# Altium footprint library WR-PHD_Socket Header.PcbLib: 273 footprints (part 12 of 18)
Each footprint in its own frame and in the unit in brackets; x right, y up, seen from the top. Pads: shape width x height; smd on the part's side, far side on the other; paste and mask are expansions set on the pad; w line width, h text height; cw(c..) or ccw(c..) is an arc to the next point about the centre after c.
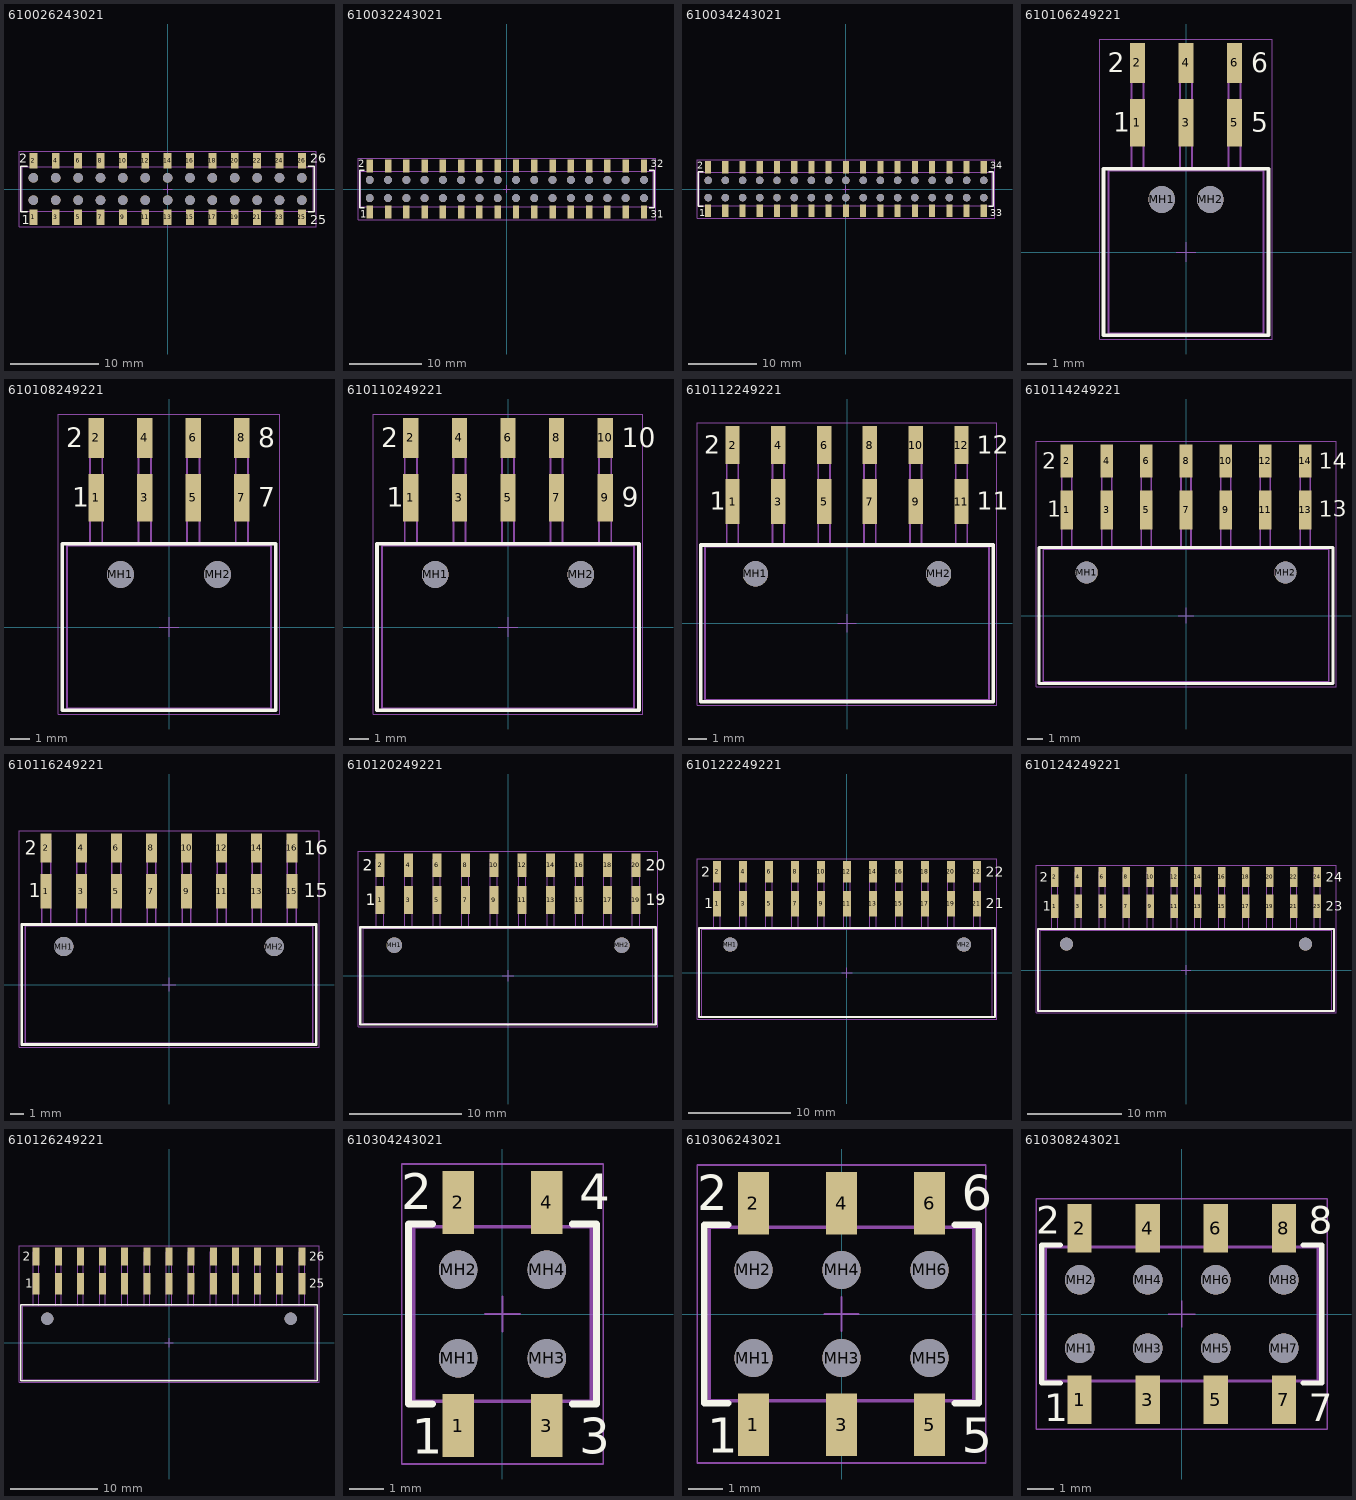
[diagram p11: the footprints below, top view; thin cyan lines are the x and y axes]

## 610026243021 [mm] "Socket Header, Pitch 2.54 mm, SMT, Vertical, dual row, 26p"
height 3.7
pads (52):
  rect 0.9x1.8 smd: 1(-15.24,-3.2) 2(-15.24,3.2) 3(-12.7,-3.2) 4(-12.7,3.2) 5(-10.16,-3.2) 6(-10.16,3.2) 7(-7.62,-3.2) 8(-7.62,3.2) 9(-5.08,-3.2) 10(-5.08,3.2) 11(-2.54,-3.2) 12(-2.54,3.2) 13(0,-3.2) 14(0,3.2) 15(2.54,-3.2) 16(2.54,3.2) 17(5.08,-3.2) 18(5.08,3.2) 19(7.62,-3.2) 20(7.62,3.2) 21(10.16,-3.2) 22(10.16,3.2) 23(12.7,-3.2) 24(12.7,3.2) 25(15.24,-3.2) 26(15.24,3.2)
  round 1.1 hole 1.1 unplated: MH1(-15.24,-1.27) MH2(-15.24,1.27) MH3(-12.7,-1.27) MH4(-12.7,1.27) MH5(-10.16,-1.27) MH6(-10.16,1.27) MH7(-7.62,-1.27) MH8(-7.62,1.27) MH9(-5.08,-1.27) MH10(-5.08,1.27) MH11(-2.54,-1.27) MH12(-2.54,1.27) MH13(0,-1.27) MH14(0,1.27) MH15(2.54,-1.27) MH16(2.54,1.27) MH17(5.08,-1.27) MH18(5.08,1.27) MH19(7.62,-1.27) MH20(7.62,1.27) MH21(10.16,-1.27) MH22(10.16,1.27) MH23(12.7,-1.27) MH24(12.7,1.27) MH25(15.24,-1.27) MH26(15.24,1.27)
Top Overlay:
  lines w0.2: -15.97,-2.575 -16.66,-2.575 -16.66,2.575 -15.97,2.575 ; 15.97,-2.575 16.66,-2.575 16.66,2.575 15.97,2.575
  text "2" at -16.87,3 h1.02
  text "1" at -16.57,-4 h1.02
  text "26" at 16.17,3 h1.02
  text "25" at 16.17,-4 h1.02
Top Designator:
  text ".Designator" at -7.498,-0.5 h1.5
Top Component Outline:
  lines w0.1: -15.49,-2.5 -15.49,-3.6 -14.99,-3.6 -14.99,-2.5 ; -15.49,2.5 -15.49,3.6 -14.99,3.6 -14.99,2.5 ; -12.95,-2.5 -12.95,-3.6 -12.45,-3.6 -12.45,-2.5 ; -12.95,2.5 -12.95,3.6 -12.45,3.6 -12.45,2.5 ; -10.41,-2.5 -10.41,-3.6 -9.91,-3.6 -9.91,-2.5 ; -10.41,2.5 -10.41,3.6 -9.91,3.6 -9.91,2.5 ; -7.87,-2.5 -7.87,-3.6 -7.37,-3.6 -7.37,-2.5 ; -7.87,2.5 -7.87,3.6 -7.37,3.6 -7.37,2.5 ; -5.33,-2.5 -5.33,-3.6 -4.83,-3.6 -4.83,-2.5 ; -5.33,2.5 -5.33,3.6 -4.83,3.6 -4.83,2.5 ; -2.79,-2.5 -2.79,-3.6 -2.29,-3.6 -2.29,-2.5 ; -2.79,2.5 -2.79,3.6 -2.29,3.6 -2.29,2.5 ; -0.25,-2.5 -0.25,-3.6 0.25,-3.6 0.25,-2.5 ; -0.25,2.5 -0.25,3.6 0.25,3.6 0.25,2.5 ; 2.29,-2.5 2.29,-3.6 2.79,-3.6 2.79,-2.5 ; 2.29,2.5 2.29,3.6 2.79,3.6 2.79,2.5 ; 4.83,-2.5 4.83,-3.6 5.33,-3.6 5.33,-2.5 ; 4.83,2.5 4.83,3.6 5.33,3.6 5.33,2.5 ; 7.37,-2.5 7.37,-3.6 7.87,-3.6 7.87,-2.5 ; 7.37,2.5 7.37,3.6 7.87,3.6 7.87,2.5 ; 9.91,-2.5 9.91,-3.6 10.41,-3.6 10.41,-2.5 ; 9.91,2.5 9.91,3.6 10.41,3.6 10.41,2.5 ; 12.45,-2.5 12.45,-3.6 12.95,-3.6 12.95,-2.5 ; 12.45,2.5 12.45,3.6 12.95,3.6 12.95,2.5 ; 14.99,-2.5 14.99,-3.6 15.49,-3.6 15.49,-2.5 ; 14.99,2.5 14.99,3.6 15.49,3.6 15.49,2.5 ; -16.51,-2.5 16.51,-2.5 16.51,2.5 -16.51,2.5 -16.51,-2.5
Top 3D Body:
  lines w0.1: -15.49,-2.5 -15.49,-3.6 -14.99,-3.6 -14.99,-2.5 ; -15.49,2.5 -15.49,3.6 -14.99,3.6 -14.99,2.5 ; -12.95,-2.5 -12.95,-3.6 -12.45,-3.6 -12.45,-2.5 ; -12.95,2.5 -12.95,3.6 -12.45,3.6 -12.45,2.5 ; -10.41,-2.5 -10.41,-3.6 -9.91,-3.6 -9.91,-2.5 ; -10.41,2.5 -10.41,3.6 -9.91,3.6 -9.91,2.5 ; -7.87,-2.5 -7.87,-3.6 -7.37,-3.6 -7.37,-2.5 ; -7.87,2.5 -7.87,3.6 -7.37,3.6 -7.37,2.5 ; -5.33,-2.5 -5.33,-3.6 -4.83,-3.6 -4.83,-2.5 ; -5.33,2.5 -5.33,3.6 -4.83,3.6 -4.83,2.5 ; -2.79,-2.5 -2.79,-3.6 -2.29,-3.6 -2.29,-2.5 ; -2.79,2.5 -2.79,3.6 -2.29,3.6 -2.29,2.5 ; -0.25,-2.5 -0.25,-3.6 0.25,-3.6 0.25,-2.5 ; -0.25,2.5 -0.25,3.6 0.25,3.6 0.25,2.5 ; 2.29,-2.5 2.29,-3.6 2.79,-3.6 2.79,-2.5 ; 2.29,2.5 2.29,3.6 2.79,3.6 2.79,2.5 ; 4.83,-2.5 4.83,-3.6 5.33,-3.6 5.33,-2.5 ; 4.83,2.5 4.83,3.6 5.33,3.6 5.33,2.5 ; 7.37,-2.5 7.37,-3.6 7.87,-3.6 7.87,-2.5 ; 7.37,2.5 7.37,3.6 7.87,3.6 7.87,2.5 ; 9.91,-2.5 9.91,-3.6 10.41,-3.6 10.41,-2.5 ; 9.91,2.5 9.91,3.6 10.41,3.6 10.41,2.5 ; 12.45,-2.5 12.45,-3.6 12.95,-3.6 12.95,-2.5 ; 12.45,2.5 12.45,3.6 12.95,3.6 12.95,2.5 ; 14.99,-2.5 14.99,-3.6 15.49,-3.6 15.49,-2.5 ; 14.99,2.5 14.99,3.6 15.49,3.6 15.49,2.5 ; -16.51,-2.5 -16.51,2.5 16.51,2.5 16.51,-2.5 -16.51,-2.5
Top Courtyard:
  lines w0.05: -0.5,0 0.5,0 ; 0,-0.5 0,0.5 ; -16.86,-4.3 -16.86,4.3 16.86,4.3 16.86,-4.3 -16.86,-4.3
3D body "610026243021.stp": height 3.7, standoff 0, extent -16.51,-3.603 16.51,3.603

## 610032243021 [mm] "Socket Header, Pitch 2.54 mm, SMT, Vertical, dual row, 32p"
height 3.7
pads (64):
  rect 0.9x1.8 smd: 1(-19.05,-3.2) 2(-19.05,3.2) 3(-16.51,-3.2) 4(-16.51,3.2) 5(-13.97,-3.2) 6(-13.97,3.2) 7(-11.43,-3.2) 8(-11.43,3.2) 9(-8.89,-3.2) 10(-8.89,3.2) 11(-6.35,-3.2) 12(-6.35,3.2) 13(-3.81,-3.2) 14(-3.81,3.2) 15(-1.27,-3.2) 16(-1.27,3.2) 17(1.27,-3.2) 18(1.27,3.2) 19(3.81,-3.2) 20(3.81,3.2) 21(6.35,-3.2) 22(6.35,3.2) 23(8.89,-3.2) 24(8.89,3.2) 25(11.43,-3.2) 26(11.43,3.2) 27(13.97,-3.2) 28(13.97,3.2) 29(16.51,-3.2) 30(16.51,3.2) 31(19.05,-3.2) 32(19.05,3.2)
  round 1.1 hole 1.1 unplated: MH1(-19.05,-1.27) MH2(-19.05,1.27) MH3(-16.51,-1.27) MH4(-16.51,1.27) MH5(-13.97,-1.27) MH6(-13.97,1.27) MH7(-11.43,-1.27) MH8(-11.43,1.27) MH9(-8.89,-1.27) MH10(-8.89,1.27) MH11(-6.35,-1.27) MH12(-6.35,1.27) MH13(-3.81,-1.27) MH14(-3.81,1.27) MH15(-1.27,-1.27) MH16(-1.27,1.27) MH17(1.27,-1.27) MH18(1.27,1.27) MH19(3.81,-1.27) MH20(3.81,1.27) MH21(6.35,-1.27) MH22(6.35,1.27) MH23(8.89,-1.27) MH24(8.89,1.27) MH25(11.43,-1.27) MH26(11.43,1.27) MH27(13.97,-1.27) MH28(13.97,1.27) MH29(16.51,-1.27) MH30(16.51,1.27) MH31(19.05,-1.27) MH32(19.05,1.27)
Top Overlay:
  lines w0.2: -19.78,-2.575 -20.47,-2.575 -20.47,2.575 -19.78,2.575 ; 19.78,-2.575 20.47,-2.575 20.47,2.575 19.78,2.575
  text "31" at 19.98,-4 h1.02
  text "32" at 19.98,3 h1.02
  text "2" at -20.68,3 h1.02
  text "1" at -20.38,-4 h1.02
Top Designator:
  text ".Designator" at -7.498,-0.5 h1.5
Top Component Outline:
  lines w0.1: -19.3,-2.5 -19.3,-3.6 -18.8,-3.6 -18.8,-2.5 ; -19.3,2.5 -19.3,3.6 -18.8,3.6 -18.8,2.5 ; -16.76,-2.5 -16.76,-3.6 -16.26,-3.6 -16.26,-2.5 ; -16.76,2.5 -16.76,3.6 -16.26,3.6 -16.26,2.5 ; -14.22,-2.5 -14.22,-3.6 -13.72,-3.6 -13.72,-2.5 ; -14.22,2.5 -14.22,3.6 -13.72,3.6 -13.72,2.5 ; -11.68,-2.5 -11.68,-3.6 -11.18,-3.6 -11.18,-2.5 ; -11.68,2.5 -11.68,3.6 -11.18,3.6 -11.18,2.5 ; -9.14,-2.5 -9.14,-3.6 -8.64,-3.6 -8.64,-2.5 ; -9.14,2.5 -9.14,3.6 -8.64,3.6 -8.64,2.5 ; -6.6,-2.5 -6.6,-3.6 -6.1,-3.6 -6.1,-2.5 ; -6.6,2.5 -6.6,3.6 -6.1,3.6 -6.1,2.5 ; -4.06,-2.5 -4.06,-3.6 -3.56,-3.6 -3.56,-2.5 ; -4.06,2.5 -4.06,3.6 -3.56,3.6 -3.56,2.5 ; -1.52,-2.5 -1.52,-3.6 -1.02,-3.6 -1.02,-2.5 ; -1.52,2.5 -1.52,3.6 -1.02,3.6 -1.02,2.5 ; 1.02,-2.5 1.02,-3.6 1.52,-3.6 1.52,-2.5 ; 1.02,2.5 1.02,3.6 1.52,3.6 1.52,2.5 ; 3.56,-2.5 3.56,-3.6 4.06,-3.6 4.06,-2.5 ; 3.56,2.5 3.56,3.6 4.06,3.6 4.06,2.5 ; 6.1,-2.5 6.1,-3.6 6.6,-3.6 6.6,-2.5 ; 6.1,2.5 6.1,3.6 6.6,3.6 6.6,2.5 ; 8.64,-2.5 8.64,-3.6 9.14,-3.6 9.14,-2.5 ; 8.64,2.5 8.64,3.6 9.14,3.6 9.14,2.5 ; 11.18,-2.5 11.18,-3.6 11.68,-3.6 11.68,-2.5 ; 11.18,2.5 11.18,3.6 11.68,3.6 11.68,2.5 ; 13.72,-2.5 13.72,-3.6 14.22,-3.6 14.22,-2.5 ; 13.72,2.5 13.72,3.6 14.22,3.6 14.22,2.5 ; 16.26,-2.5 16.26,-3.6 16.76,-3.6 16.76,-2.5 ; 16.26,2.5 16.26,3.6 16.76,3.6 16.76,2.5 ; 18.8,-2.5 18.8,-3.6 19.3,-3.6 19.3,-2.5 ; 18.8,2.5 18.8,3.6 19.3,3.6 19.3,2.5 ; -20.32,-2.5 20.32,-2.5 20.32,2.5 -20.32,2.5 -20.32,-2.5
Top 3D Body:
  lines w0.1: -19.3,-2.5 -19.3,-3.6 -18.8,-3.6 -18.8,-2.5 ; -19.3,2.5 -19.3,3.6 -18.8,3.6 -18.8,2.5 ; -16.76,-2.5 -16.76,-3.6 -16.26,-3.6 -16.26,-2.5 ; -16.76,2.5 -16.76,3.6 -16.26,3.6 -16.26,2.5 ; -14.22,-2.5 -14.22,-3.6 -13.72,-3.6 -13.72,-2.5 ; -14.22,2.5 -14.22,3.6 -13.72,3.6 -13.72,2.5 ; -11.68,-2.5 -11.68,-3.6 -11.18,-3.6 -11.18,-2.5 ; -11.68,2.5 -11.68,3.6 -11.18,3.6 -11.18,2.5 ; -9.14,-2.5 -9.14,-3.6 -8.64,-3.6 -8.64,-2.5 ; -9.14,2.5 -9.14,3.6 -8.64,3.6 -8.64,2.5 ; -6.6,-2.5 -6.6,-3.6 -6.1,-3.6 -6.1,-2.5 ; -6.6,2.5 -6.6,3.6 -6.1,3.6 -6.1,2.5 ; -4.06,-2.5 -4.06,-3.6 -3.56,-3.6 -3.56,-2.5 ; -4.06,2.5 -4.06,3.6 -3.56,3.6 -3.56,2.5 ; -1.52,-2.5 -1.52,-3.6 -1.02,-3.6 -1.02,-2.5 ; -1.52,2.5 -1.52,3.6 -1.02,3.6 -1.02,2.5 ; 1.02,-2.5 1.02,-3.6 1.52,-3.6 1.52,-2.5 ; 1.02,2.5 1.02,3.6 1.52,3.6 1.52,2.5 ; 3.56,-2.5 3.56,-3.6 4.06,-3.6 4.06,-2.5 ; 3.56,2.5 3.56,3.6 4.06,3.6 4.06,2.5 ; 6.1,-2.5 6.1,-3.6 6.6,-3.6 6.6,-2.5 ; 6.1,2.5 6.1,3.6 6.6,3.6 6.6,2.5 ; 8.64,-2.5 8.64,-3.6 9.14,-3.6 9.14,-2.5 ; 8.64,2.5 8.64,3.6 9.14,3.6 9.14,2.5 ; 11.18,-2.5 11.18,-3.6 11.68,-3.6 11.68,-2.5 ; 11.18,2.5 11.18,3.6 11.68,3.6 11.68,2.5 ; 13.72,-2.5 13.72,-3.6 14.22,-3.6 14.22,-2.5 ; 13.72,2.5 13.72,3.6 14.22,3.6 14.22,2.5 ; 16.26,-2.5 16.26,-3.6 16.76,-3.6 16.76,-2.5 ; 16.26,2.5 16.26,3.6 16.76,3.6 16.76,2.5 ; 18.8,-2.5 18.8,-3.6 19.3,-3.6 19.3,-2.5 ; 18.8,2.5 18.8,3.6 19.3,3.6 19.3,2.5 ; -20.32,-2.5 -20.32,2.5 20.32,2.5 20.32,-2.5 -20.32,-2.5
Top Courtyard:
  lines w0.05: -0.5,0 0.5,0 ; 0,-0.5 0,0.5 ; -20.67,-4.3 -20.67,4.3 20.67,4.3 20.67,-4.3 -20.67,-4.3
3D body "610032243021.stp": height 3.7, standoff 0, extent -20.32,-3.603 20.32,3.603

## 610034243021 [mm] "Socket Header, Pitch 2.54 mm, SMT, Vertical, dual row, 34p"
height 3.7
pads (68):
  rect 0.9x1.8 smd: 1(-20.32,-3.2) 2(-20.32,3.2) 3(-17.78,-3.2) 4(-17.78,3.2) 5(-15.24,-3.2) 6(-15.24,3.2) 7(-12.7,-3.2) 8(-12.7,3.2) 9(-10.16,-3.2) 10(-10.16,3.2) 11(-7.62,-3.2) 12(-7.62,3.2) 13(-5.08,-3.2) 14(-5.08,3.2) 15(-2.54,-3.2) 16(-2.54,3.2) 17(0,-3.2) 18(0,3.2) 19(2.54,-3.2) 20(2.54,3.2) 21(5.08,-3.2) 22(5.08,3.2) 23(7.62,-3.2) 24(7.62,3.2) 25(10.16,-3.2) 26(10.16,3.2) 27(12.7,-3.2) 28(12.7,3.2) 29(15.24,-3.2) 30(15.24,3.2) 31(17.78,-3.2) 32(17.78,3.2) 33(20.32,-3.2) 34(20.32,3.2)
  round 1.1 hole 1.1 unplated: MH1(-20.32,-1.27) MH2(-20.32,1.27) MH3(-17.78,-1.27) MH4(-17.78,1.27) MH5(-15.24,-1.27) MH6(-15.24,1.27) MH7(-12.7,-1.27) MH8(-12.7,1.27) MH9(-10.16,-1.27) MH10(-10.16,1.27) MH11(-7.62,-1.27) MH12(-7.62,1.27) MH13(-5.08,-1.27) MH14(-5.08,1.27) MH15(-2.54,-1.27) MH16(-2.54,1.27) MH17(0,-1.27) MH18(0,1.27) MH19(2.54,-1.27) MH20(2.54,1.27) MH21(5.08,-1.27) MH22(5.08,1.27) MH23(7.62,-1.27) MH24(7.62,1.27) MH25(10.16,-1.27) MH26(10.16,1.27) MH27(12.7,-1.27) MH28(12.7,1.27) MH29(15.24,-1.27) MH30(15.24,1.27) MH31(17.78,-1.27) MH32(17.78,1.27) MH33(20.32,-1.27) MH34(20.32,1.27)
Top Overlay:
  lines w0.2: -21.05,-2.575 -21.74,-2.575 -21.74,2.575 -21.05,2.575 ; 21.05,-2.575 21.74,-2.575 21.74,2.575 21.05,2.575
  text "1" at -21.65,-4 h1.02
  text "2" at -21.95,3 h1.02
  text "34" at 21.25,3 h1.02
  text "33" at 21.25,-4 h1.02
Top Designator:
  text ".Designator" at -7.498,-0.5 h1.5
Top Component Outline:
  lines w0.1: -20.57,-2.5 -20.57,-3.6 -20.07,-3.6 -20.07,-2.5 ; -20.57,2.5 -20.57,3.6 -20.07,3.6 -20.07,2.5 ; -18.03,-2.5 -18.03,-3.6 -17.53,-3.6 -17.53,-2.5 ; -18.03,2.5 -18.03,3.6 -17.53,3.6 -17.53,2.5 ; -15.49,-2.5 -15.49,-3.6 -14.99,-3.6 -14.99,-2.5 ; -15.49,2.5 -15.49,3.6 -14.99,3.6 -14.99,2.5 ; -12.95,-2.5 -12.95,-3.6 -12.45,-3.6 -12.45,-2.5 ; -12.95,2.5 -12.95,3.6 -12.45,3.6 -12.45,2.5 ; -10.41,-2.5 -10.41,-3.6 -9.91,-3.6 -9.91,-2.5 ; -10.41,2.5 -10.41,3.6 -9.91,3.6 -9.91,2.5 ; -7.87,-2.5 -7.87,-3.6 -7.37,-3.6 -7.37,-2.5 ; -7.87,2.5 -7.87,3.6 -7.37,3.6 -7.37,2.5 ; -5.33,-2.5 -5.33,-3.6 -4.83,-3.6 -4.83,-2.5 ; -5.33,2.5 -5.33,3.6 -4.83,3.6 -4.83,2.5 ; -2.79,-2.5 -2.79,-3.6 -2.29,-3.6 -2.29,-2.5 ; -2.79,2.5 -2.79,3.6 -2.29,3.6 -2.29,2.5 ; -0.25,-2.5 -0.25,-3.6 0.25,-3.6 0.25,-2.5 ; -0.25,2.5 -0.25,3.6 0.25,3.6 0.25,2.5 ; 2.29,-2.5 2.29,-3.6 2.79,-3.6 2.79,-2.5 ; 2.29,2.5 2.29,3.6 2.79,3.6 2.79,2.5 ; 4.83,-2.5 4.83,-3.6 5.33,-3.6 5.33,-2.5 ; 4.83,2.5 4.83,3.6 5.33,3.6 5.33,2.5 ; 7.37,-2.5 7.37,-3.6 7.87,-3.6 7.87,-2.5 ; 7.37,2.5 7.37,3.6 7.87,3.6 7.87,2.5 ; 9.91,-2.5 9.91,-3.6 10.41,-3.6 10.41,-2.5 ; 9.91,2.5 9.91,3.6 10.41,3.6 10.41,2.5 ; 12.45,-2.5 12.45,-3.6 12.95,-3.6 12.95,-2.5 ; 12.45,2.5 12.45,3.6 12.95,3.6 12.95,2.5 ; 14.99,-2.5 14.99,-3.6 15.49,-3.6 15.49,-2.5 ; 14.99,2.5 14.99,3.6 15.49,3.6 15.49,2.5 ; 17.53,-2.5 17.53,-3.6 18.03,-3.6 18.03,-2.5 ; 17.53,2.5 17.53,3.6 18.03,3.6 18.03,2.5 ; 20.07,-2.5 20.07,-3.6 20.57,-3.6 20.57,-2.5 ; 20.07,2.5 20.07,3.6 20.57,3.6 20.57,2.5 ; -21.59,-2.5 -21.59,2.5 21.59,2.5 21.59,-2.5 -21.59,-2.5
Top 3D Body:
  lines w0.1: -20.57,-2.5 -20.57,-3.6 -20.07,-3.6 -20.07,-2.5 ; -20.57,2.5 -20.57,3.6 -20.07,3.6 -20.07,2.5 ; -18.03,-2.5 -18.03,-3.6 -17.53,-3.6 -17.53,-2.5 ; -18.03,2.5 -18.03,3.6 -17.53,3.6 -17.53,2.5 ; -15.49,-2.5 -15.49,-3.6 -14.99,-3.6 -14.99,-2.5 ; -15.49,2.5 -15.49,3.6 -14.99,3.6 -14.99,2.5 ; -12.95,-2.5 -12.95,-3.6 -12.45,-3.6 -12.45,-2.5 ; -12.95,2.5 -12.95,3.6 -12.45,3.6 -12.45,2.5 ; -10.41,-2.5 -10.41,-3.6 -9.91,-3.6 -9.91,-2.5 ; -10.41,2.5 -10.41,3.6 -9.91,3.6 -9.91,2.5 ; -7.87,-2.5 -7.87,-3.6 -7.37,-3.6 -7.37,-2.5 ; -7.87,2.5 -7.87,3.6 -7.37,3.6 -7.37,2.5 ; -5.33,-2.5 -5.33,-3.6 -4.83,-3.6 -4.83,-2.5 ; -5.33,2.5 -5.33,3.6 -4.83,3.6 -4.83,2.5 ; -2.79,-2.5 -2.79,-3.6 -2.29,-3.6 -2.29,-2.5 ; -2.79,2.5 -2.79,3.6 -2.29,3.6 -2.29,2.5 ; -0.25,-2.5 -0.25,-3.6 0.25,-3.6 0.25,-2.5 ; -0.25,2.5 -0.25,3.6 0.25,3.6 0.25,2.5 ; 2.29,-2.5 2.29,-3.6 2.79,-3.6 2.79,-2.5 ; 2.29,2.5 2.29,3.6 2.79,3.6 2.79,2.5 ; 4.83,-2.5 4.83,-3.6 5.33,-3.6 5.33,-2.5 ; 4.83,2.5 4.83,3.6 5.33,3.6 5.33,2.5 ; 7.37,-2.5 7.37,-3.6 7.87,-3.6 7.87,-2.5 ; 7.37,2.5 7.37,3.6 7.87,3.6 7.87,2.5 ; 9.91,-2.5 9.91,-3.6 10.41,-3.6 10.41,-2.5 ; 9.91,2.5 9.91,3.6 10.41,3.6 10.41,2.5 ; 12.45,-2.5 12.45,-3.6 12.95,-3.6 12.95,-2.5 ; 12.45,2.5 12.45,3.6 12.95,3.6 12.95,2.5 ; 14.99,-2.5 14.99,-3.6 15.49,-3.6 15.49,-2.5 ; 14.99,2.5 14.99,3.6 15.49,3.6 15.49,2.5 ; 17.53,-2.5 17.53,-3.6 18.03,-3.6 18.03,-2.5 ; 17.53,2.5 17.53,3.6 18.03,3.6 18.03,2.5 ; 20.07,-2.5 20.07,-3.6 20.57,-3.6 20.57,-2.5 ; 20.07,2.5 20.07,3.6 20.57,3.6 20.57,2.5 ; -21.59,-2.5 21.59,-2.5 21.59,2.5 -21.59,2.5 -21.59,-2.5
Top Courtyard:
  lines w0.05: -0.5,0 0.5,0 ; 0,-0.5 0,0.5 ; -21.94,-4.3 21.94,-4.3 21.94,4.3 -21.94,4.3 -21.94,-4.3
3D body "610034243021.stp": height 3.7, standoff 0, extent -21.59,-3.603 21.59,3.603

## 610106249221 [mm] "Socket Header, Pitch 2.54 mm, SMT, Angled, dual row, 6p"
height 5.2
pads (8):
  rect 0.8x2.5 smd: 1(-2.54,6.76) 3(0,6.76) 5(2.54,6.76)
  rect 0.8x2.1 smd: 2(-2.54,9.89) 4(0,9.89) 6(2.54,9.89)
  round 1.4 hole 1.4 unplated: MH1(-1.27,2.75) MH2(1.27,2.75)
Top Overlay:
  lines w0.2: -4.31,-4.35 -4.31,4.35 4.31,4.35 4.31,-4.35 -4.31,-4.35
  text "6" at 3.4,9.4 h1.02
  text "5" at 3.4,6.3 h1.02
  text "2" at -4.1,9.4 h1.02
  text "1" at -3.8,6.3 h1.02
Top Designator:
  text ".Designator" at -7.498,-0.5 h1.5
Top Component Outline:
  lines w0.1: -2.86,4.25 -2.86,10.44 -2.22,10.44 -2.22,4.25 ; -2.86,7.49 -2.22,7.49 ; -0.32,4.25 -0.32,10.44 0.32,10.44 0.32,4.25 ; -0.32,7.49 0.32,7.49 ; 2.22,4.25 2.22,10.44 2.86,10.44 2.86,4.25 ; 2.22,7.49 2.86,7.49 ; -4.06,-4.25 -4.06,4.25 4.06,4.25 4.06,-4.25 -4.06,-4.25
Top 3D Body:
  lines w0.1: -2.86,4.25 -2.86,10.44 -2.22,10.44 -2.22,4.25 ; -2.86,7.49 -2.22,7.49 ; -0.32,4.25 -0.32,10.44 0.32,10.44 0.32,4.25 ; -0.32,7.49 0.32,7.49 ; 2.22,4.25 2.22,10.44 2.86,10.44 2.86,4.25 ; 2.22,7.49 2.86,7.49 ; -4.06,-4.25 4.06,-4.25 4.06,4.25 -4.06,4.25 -4.06,-4.25
Top Courtyard:
  lines w0.05: -0.5,0 0.5,0 ; 0,-0.5 0,0.5 ; -4.51,-4.55 4.51,-4.55 4.51,11.14 -4.51,11.14 -4.51,-4.55
3D body "610106249221.stp": height 5.03, standoff -1.27, extent -4.06,-4.25 4.06,10.44

## 610108249221 [mm] "Socket Header, Pitch 2.54 mm, SMT, Angled, dual row, 8p"
height 5.2
pads (10):
  rect 0.8x2.5 smd: 1(-3.81,6.76) 3(-1.27,6.76) 5(1.27,6.76) 7(3.81,6.76)
  rect 0.8x2.1 smd: 2(-3.81,9.89) 4(-1.27,9.89) 6(1.27,9.89) 8(3.81,9.89)
  round 1.4 hole 1.4 unplated: MH1(-2.54,2.75) MH2(2.54,2.75)
Top Overlay:
  lines w0.2: -5.58,-4.35 -5.58,4.35 5.58,4.35 5.58,-4.35 -5.58,-4.35
  text "8" at 4.67,9.4 h1.02
  text "7" at 4.67,6.3 h1.02
  text "2" at -5.37,9.4 h1.02
  text "1" at -5.07,6.3 h1.02
Top Designator:
  text ".Designator" at -7.498,-0.5 h1.5
Top Component Outline:
  lines w0.1: -4.13,4.25 -4.13,10.44 -3.49,10.44 -3.49,4.25 ; -4.13,7.49 -3.49,7.49 ; -1.59,4.25 -1.59,10.44 -0.95,10.44 -0.95,4.25 ; -1.59,7.49 -0.95,7.49 ; 0.95,4.25 0.95,10.44 1.59,10.44 1.59,4.25 ; 0.95,7.49 1.59,7.49 ; 3.49,4.25 3.49,10.44 4.13,10.44 4.13,4.25 ; 3.49,7.49 4.13,7.49 ; -5.33,-4.25 -5.33,4.25 5.33,4.25 5.33,-4.25 -5.33,-4.25
Top 3D Body:
  lines w0.1: -4.13,4.25 -4.13,10.44 -3.49,10.44 -3.49,4.25 ; -4.13,7.49 -3.49,7.49 ; -1.59,4.25 -1.59,10.44 -0.95,10.44 -0.95,4.25 ; -1.59,7.49 -0.95,7.49 ; 0.95,4.25 0.95,10.44 1.59,10.44 1.59,4.25 ; 0.95,7.49 1.59,7.49 ; 3.49,4.25 3.49,10.44 4.13,10.44 4.13,4.25 ; 3.49,7.49 4.13,7.49 ; -5.33,-4.25 5.33,-4.25 5.33,4.25 -5.33,4.25 -5.33,-4.25
Top Courtyard:
  lines w0.05: -0.5,0 0.5,0 ; 0,-0.5 0,0.5 ; -5.78,-4.55 5.78,-4.55 5.78,11.14 -5.78,11.14 -5.78,-4.55
3D body "610108249221.stp": height 5.03, standoff -1.27, extent -5.33,-4.25 5.33,10.44

## 610110249221 [mm] "Socket Header, Pitch 2.54 mm, SMT, Angled, dual row, 10p"
height 5.2
pads (12):
  rect 0.8x2.5 smd: 1(-5.08,6.76) 3(-2.54,6.76) 5(0,6.76) 7(2.54,6.76) 9(5.08,6.76)
  rect 0.8x2.1 smd: 2(-5.08,9.89) 4(-2.54,9.89) 6(0,9.89) 8(2.54,9.89) 10(5.08,9.89)
  round 1.4 hole 1.4 unplated: MH1(-3.81,2.75) MH2(3.81,2.75)
Top Overlay:
  lines w0.2: -6.85,-4.35 6.85,-4.35 6.85,4.35 -6.85,4.35 -6.85,-4.35
  text "10" at 5.94,9.4 h1.02
  text "9" at 5.94,6.3 h1.02
  text "1" at -6.34,6.3 h1.02
  text "2" at -6.64,9.4 h1.02
Top Designator:
  text ".Designator" at -7.498,-0.5 h1.5
Top Component Outline:
  lines w0.1: -5.4,4.25 -5.4,10.44 -4.76,10.44 -4.76,4.25 ; -5.4,7.49 -4.76,7.49 ; -2.86,4.25 -2.86,10.44 -2.22,10.44 -2.22,4.25 ; -2.86,7.49 -2.22,7.49 ; -0.32,4.25 -0.32,10.44 0.32,10.44 0.32,4.25 ; -0.32,7.49 0.32,7.49 ; 2.22,4.25 2.22,10.44 2.86,10.44 2.86,4.25 ; 2.22,7.49 2.86,7.49 ; 4.76,4.25 4.76,10.44 5.4,10.44 5.4,4.25 ; 4.76,7.49 5.4,7.49 ; -6.6,-4.25 -6.6,4.25 6.6,4.25 6.6,-4.25 -6.6,-4.25
Top 3D Body:
  lines w0.1: -5.4,4.25 -5.4,10.44 -4.76,10.44 -4.76,4.25 ; -5.4,7.49 -4.76,7.49 ; -2.86,4.25 -2.86,10.44 -2.22,10.44 -2.22,4.25 ; -2.86,7.49 -2.22,7.49 ; -0.32,4.25 -0.32,10.44 0.32,10.44 0.32,4.25 ; -0.32,7.49 0.32,7.49 ; 2.22,4.25 2.22,10.44 2.86,10.44 2.86,4.25 ; 2.22,7.49 2.86,7.49 ; 4.76,4.25 4.76,10.44 5.4,10.44 5.4,4.25 ; 4.76,7.49 5.4,7.49 ; -6.6,-4.25 -6.6,4.25 6.6,4.25 6.6,-4.25 -6.6,-4.25
Top Courtyard:
  lines w0.05: -0.5,0 0.5,0 ; 0,-0.5 0,0.5 ; -7.05,-4.55 -7.05,11.14 7.05,11.14 7.05,-4.55 -7.05,-4.55
3D body "610110249221.stp": height 5.03, standoff -1.27, extent -6.6,-4.25 6.6,10.44